# Altium integrated library Audio_Research.IntLib: 75 symbols
Pins are listed as number, name and electrical type; pins without a type are passive.

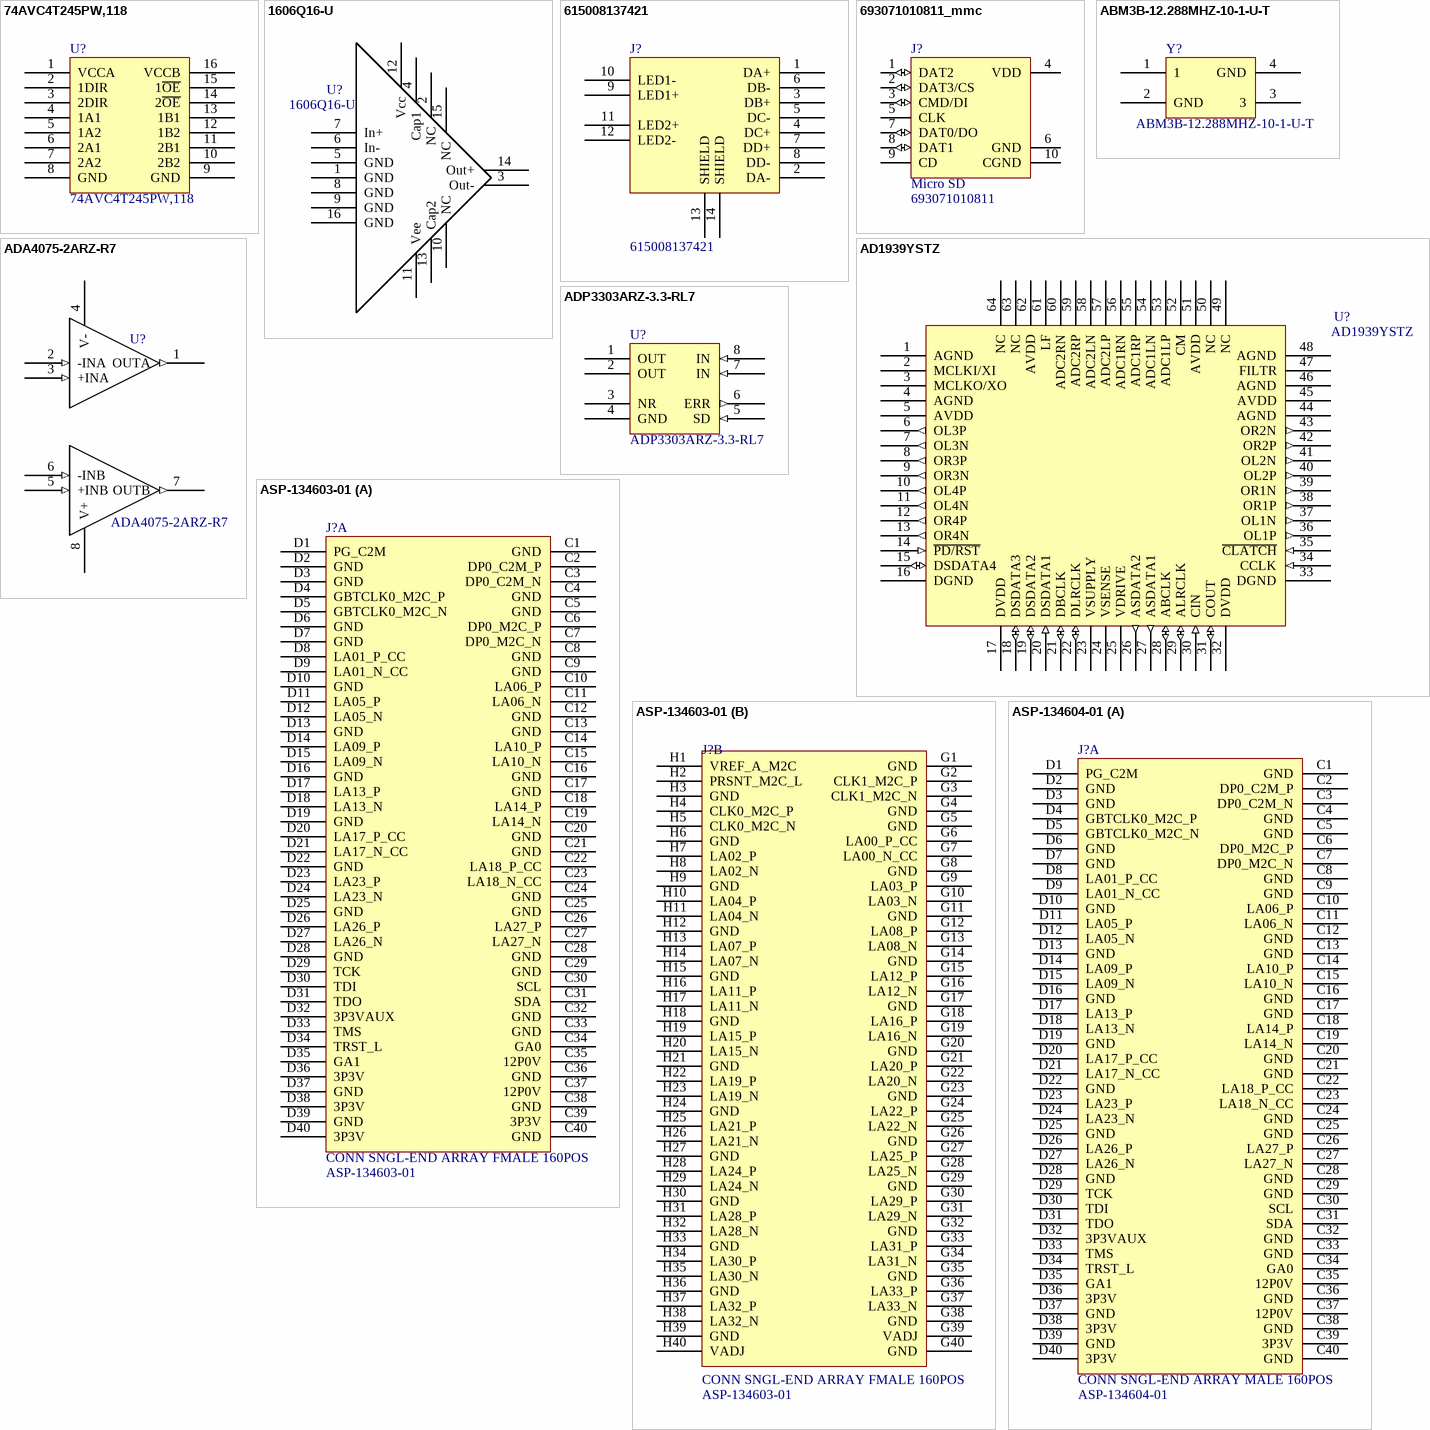
[diagram p0: symbols 74AVC4T245PW,118 to ASP-134604-01]

## 74AVC4T245PW,118
designator U?, comment Manufacturer Part Number: 74AVC4T245PW,118  (hidden comment: IC TXRX 4BIT DUAL 3ST 16TSSOP)
Voltage Level Translator Bidirectional 2 Circuit 2 Channel 380Mbps 16-TSSOP; Manufacturer: NXP Semiconductors; Max Supply Voltage: 3.6V; Min Supply Voltage: 800mV; Propagation Delay: 14.7ns; Number of Channels: 4; Number of Elements: 2; Logic Function: Transceiver,Translator; Low Level Output Current: 12mA; Turn-On Delay Time: 14.5ns; Polarity: Non-Inverting; High Level Output Current: -12mA; Quiescent Current: 70uA; Supplier 1: Digi-Key; Stock 1: 1680; Pricing 1: 1=0.9, 10=0.798, 25=0.72, 100=0.63, 250=0.5525, 500=0.49, 1000=0.3875 (USD); Mount: Surface Mount; Case/Package: TSSOP; Number of Pins: 16; Contact Plating: Gold; Min Operating Temperature: -40°C; Max Operating Temperature: 125°C; Packaging: Tape and Reel; Package Quantity: 2500; Data Rate: 380Mbps; Number of Bits: 4; Number of Circuits: 2; Radiation Hardening: No; Lead Free: Lead Free; ComponentLink1URL: https://datasheet.ciiva.com/1900/74avc4t245-1900214.pdf; ComponentLink1Description: https://datasheet.ciiva.com/1900/74avc4t245-1900214.pdf; ComponentLink2URL: https://datasheet.ciiva.com/1900/74avc4t245-1900215.pdf; ComponentLink2Description: https://datasheet.ciiva.com/1900/74avc4t245-1900215.pdf; ComponentLink3URL: https://datasheet.ciiva.com/1900/74avc4t245-1900216.pdf; ComponentLink3Description: https://datasheet.ciiva.com/1900/74avc4t245-1900216.pdf; ComponentLink4URL: https://datasheet.ciiva.com/15086/getdatasheetpartid-442686-15086830.pdf; ComponentLink4Description: https://datasheet.ciiva.com/15086/getdatasheetpartid-442686-15086830.pdf; Supplier Part Number 1: 568-8847-1-ND
footprint TSOP65P640X120-16N (TSOP, 16-Leads, Body 5.00x4.40mm, Pitch 0.65mm, IPC Medium Density)
pins: 1 VCCA, 2 1DIR, 3 2DIR, 4 1A1, 5 1A2, 6 2A1, 7 2A2, 8 GND, 9 GND, 10 2B2, 11 2B1, 12 1B2, 13 1B1, 14 2~{OE}, 15 1~{OE}, 16 VCCB

## 1606Q16-U
designator U?
Audio Amplifiers Balanced Audio Line Driver IC; Manufacturer: THAT; Max Supply Voltage: 18V; Min Supply Voltage: 4V; Nominal Supply Current: 4.9mA; Supplier 1: Mouser; Stock 1: 3475; Pricing 1: 1=4.65, 10=4.65, 50=3.91, 100=3.35, 1000=2.79, 10000=2.6 (USD); Case/Package: QSOP; Min Operating Temperature: -40°C; Max Operating Temperature: 85°C; Package Quantity: 98; Packaging: Rail/Tube; ComponentLink1URL: http://www.mouser.com/ds/2/407/1600data-6754.pdf; ComponentLink1Description: http://www.mouser.com/ds/2/407/1600data-6754.pdf; Supplier Part Number 1: 887-1606Q16-U; Manufacturer Part Number: 1606Q16-U
footprint SOP64P600X175-16N (SOP, 16-Leads, Body 4.89x3.90mm, Pitch 0.64mm, IPC Medium Density)
pins: 1 GND, 2 NC, 3 Out-, 4 Cap1, 5 GND, 6 In-, 7 In+, 8 GND, 9 GND, 10 NC, 11 Vee, 12 Vcc, 13 Cap2, 14 Out+, 15 NC, 16 GND

## 615008137421
designator J?, comment Manufacturer Part Number: 615008137421  (hidden comment: CONN MOD JACK 8P8C R/A SHIELDED)
Jack Modular Connector 8p8c (RJ45, Ethernet) 90° Angle (Right) Shielded, EMI Finger Cat5; Manufacturer: Wurth Electronics; Current Rating: 1.5A; Mating Cycles: 500; Gender: Female; Connector Type: RJ45,Socket,Jack; Voltage Rating (AC): 120V; Number of Positions: 8; Number of Ports: 1; Insulation Resistance: 500MR; Direction: Up; Supplier 1: Digi-Key; Stock 1: 1494; Pricing 1: 1=2.67, 10=2.621, 50=2.52, 100=2.419, 250=2.318 (USD); Mount: Through Hole,PCB; Contact Plating: Tin,Gold; Contact Material: Copper Alloy; Colour: Black,Green,Yellow; Housing Material: PBT; Min Operating Temperature: -40°C; Max Operating Temperature: 85°C; Shielding: Shielded; Packaging: Tray; Package Quantity: 60; Number of Rows: 1; Termination: Through Hole; Number of Contacts: 8; Orientation: Right Angle; Length: 13.46mm; Height: 16.93mm; Width: 16.25mm; Depth: 15.75mm; REACH SVHC: Unknown; Flammability Rating: UL94 V-0; ComponentLink1URL: https://datasheet.ciiva.com/11726/0900766b80f88673-11726176.pdf; ComponentLink1Description: https://datasheet.ciiva.com/11726/0900766b80f88673-11726176.pdf; ComponentLink2URL: https://datasheet.ciiva.com/4561/615008137421-71402-4561624.pdf; ComponentLink2Description: https://datasheet.ciiva.com/4561/615008137421-71402-4561624.pdf; ComponentLink3URL: https://datasheet.ciiva.com/686/615008137421-686729.pdf; ComponentLink3Description: https://datasheet.ciiva.com/686/615008137421-686729.pdf; ComponentLink4URL: https://datasheet.ciiva.com/6913/76606-6913951.pdf; ComponentLink4Description: https://datasheet.ciiva.com/6913/76606-6913951.pdf; ComponentLink5URL: https://datasheet.ciiva.com/48689/001088215-da-01-en-wr-com-modular-jack-615008137421-48689541.pdf; ComponentLink5Description: https://datasheet.ciiva.com/48689/001088215-da-01-en-wr-com-modular-jack-615008137421-48689541.pdf; Supplier Part Number 1: 732-2112-ND
footprint RJ45 (RJ45 Ethernet Connector)
pins: 1 DA+, 2 DA-, 3 DB+, 4 DC+, 5 DC-, 6 DB-, 7 DD+, 8 DD-, 9 LED1+, 10 LED1-, 11 LED2+, 12 LED2-, 13 SHIELD, 14 SHIELD

## 693071010811_mmc
designator J?, comment Micro SD  Manufacturer Part Number: 693071010811
CONN MICRO SD 8 POS SMD; Manufacturer: Wurth Electronics Inc; Number of Positions: 9 (8 + 1); Connector Type: Connector and Ejector; Insertion, Removal Method: Push In, Push Out; Card Type: Secure Digital - microSD; Supplier 1: Digi-Key; RoHS: RoHS Compliant; Category: Connectors, Interconnects; Stock 1: 6758; Pricing 1: 1=3.32, 10=3.188, 50=2.805, 100=2.6775, 500=2.295, 1400=2.10375 (USD); Packaging: Cut Tape (CT); Ejector Side: -; Mounting Type: Surface Mount, Right Angle; Features: Switch; Height Above Board: 0.072" (1.83mm); Mounting Feature: Normal, Standard - Top; Contact Finish: Gold; Contact Finish Thickness: -; ComponentLink1URL: http://katalog.we-online.de/em/datasheet/693071010811.pdf; ComponentLink1Description: http://katalog.we-online.de/em/datasheet/693071010811.pdf; Supplier Part Number 1: 732-3819-1-ND
footprint 693071010811 (CONN MICRO SD 8 POS SMD)
pins: 1 DAT2 (io), 2 DAT3/CS (io), 3 CMD/DI (io), 4 VDD (power), 5 CLK, 6 GND, 7 DAT0/DO (io), 8 DAT1 (io), 9 CD, 10 CGND

## ABM3B-12.288MHZ-10-1-U-T
designator Y?
12.288MHz ±10ppm Crystal 10pF 70 Ohm -10°C ~ 60°C Surface Mount 4-SMD, No Lead (DFN, LCC); Manufacturer: Abracon LLC; ESR (Equivalent Series Resistance): 70 Ohm; Operating Mode: Fundamental; Supplier 1: Digi-Key; RoHS: RoHS Compliant; Category: Crystals and Oscillators; Stock 1: 1220; Pricing 1: 1=1.09, 10=0.968, 50=0.904, 100=0.8, 500=0.756 (USD); Packaging: Cut Tape (CT); Part Status: Active; Type: MHz Crystal; Frequency: 12.288MHz; Frequency Stability: ±10ppm; Frequency Tolerance: ±10ppm; Load Capacitance: 10pF; Operating Temperature: -10°C ~ 60°C; Ratings: -; Mounting Type: Surface Mount; Package / Case: 4-SMD, No Lead (DFN, LCC); Size / Dimension: 0.197" L x 0.126" W (5.00mm x 3.20mm); Height: 0.043" (1.10mm); ComponentLink1URL: http://www.abracon.com/Resonators/abm3b.pdf; ComponentLink1Description: http://www.abracon.com/Resonators/abm3b.pdf; Supplier Part Number 1: 300-8198-1-ND; Manufacturer Part Number: ABM3B-12.288MHZ-10-1-U-T
footprint ADM3B (Ceramic SMD Crystal)
pins: 1, 2 GND, 3, 4 GND

## AD1939YSTZ
designator U?
Single-chip codec that prvides 4 ADCs with differential input and 8 DACs with differential output; Manufacturer: Analog Devices Inc.; Data Interface: Serial; Resolution (Bits): 24 b; Number of ADCs / DACs: 4 / 8; Sigma Delta: Yes; S/N Ratio, ADCs / DACs (db) Typ: 94 / 94; Dynamic Range, ADCs / DACs (db) Typ: 105 / 110; Voltage - Supply, Analog: 3 V ~ 3.6 V; Supplier 1: Digi-Key; RoHS: RoHS Compliant; Category: Integrated Circuits (ICs); Stock 1: 432; Pricing 1: 1=15.81, 10=14.527, 100=12.269, 500=10.91416, 1000=10.01091, 2500=9.63456, 5000=9.33348 (USD); Packaging: Tray; Type: General Purpose; Voltage - Supply, Digital: 3 V ~ 3.6 V; Operating Temperature: -40°C ~ 105°C; Mounting Type: Surface Mount; Package / Case: 64-LQFP; Supplier Device Package: 64-LQFP (10x10); ComponentLink1URL: http://www.analog.com/media/en/technical-documentation/data-sheets/AD1939.pdf; ComponentLink1Description: http://www.analog.com/media/en/technical-documentation/data-sheets/AD1939.pdf; Supplier Part Number 1: AD1939YSTZ-ND; Manufacturer Part Number: AD1939YSTZ
footprint ST_64_2
pins: 1 AGND "Analog Ground", 2 MCLKI/XI "Master Clock Input/Crystal Oscillator Input", 3 MCLKO/XO "Master Clock Output/Crystal Oscillator Output", 4 AGND "Analog Ground", 5 AVDD "Analog Power Supply. Connect to analog 3.3V Supply", 6 OL3P (out) "DAC 3 Left Positive Output", 7 OL3N (out) "DAC 3 Left Negative Output", 8 OR3P (out) "DAC 3 Right Positive Output", 9 OR3N (out) "DAC 3 Right Neagtive Output", 10 OL4P (out) "DAC 4 Left Positivie Output", 11 OL4N (out) "DAC 4 Left Negative Output", 12 OR4P (out) "DAC 4 Right Positivie Output", 13 OR4N (out) "DAC 4 Right Negative Output", 14 ~{PD/RST} (in) "Power-Down Reset (Active Low)", 15 DSDATA4 (io) "DAC Sderial Data Input 4. Data input to DAC4 data in/TDM DAC2 data out (dual-line mode)/AUX DAC2 data out (to external DAC2)", 16 DGND "Digital Ground", 17 DVDD "Digital Power Supply. Connect to digital 3.3 V supply", 18 DSDATA3 (io) "DAC Serial Data Input 3. Data input to DAC3 data in/TDM DAC2 data out (dual-line mode)/AUX DAC2 data out (to external DAC2)", 19 DSDATA2 (io) "DAC Serial Data Input 2. Data input to DAC2 data in/TDM DAC data out/AUX ADC1 data in (from external ADC1)", 20 DSDATA1 (in) "DAC Serial Data Input 1. Data input to Dac1 data in/TDM DAC data in/TDM data in", 21 DBCLK (io) "Bit Clock fo DACs", 22 DLRCLK (io) "LR Clock for DACs", 23 VSUPPLY "5V Input to Regulator, Emitter of Pass Transistor", 24 VSENSE "3.3V Output of Regulator Collector of Pass Transistor", 25 VDRIVE "Drive for Base of Pass Transistro", 26 ASDATA2 (out) "ADC Serial Data Output 2. Data Output from ADC2/TDM ADC data in/AUX DAC1 data out (to external DAC1).", 27 ASDATA1 (out) "ADC Serial Data Output 1. Data Output from ADC1/TDM ADC data out/TDM data out", 28 ABCLK (io) "Bit Clock fo ADCs", 29 ALRCLK (io) "LR Clock for ADCs", 30 CIN (in) "Control Data Input (SPI)", 31 COUT (io) "Control Data Output (SPI)", 32 DVDD "Digitial Power Supply. Connect to digital 3.3V supply", 33 DGND "Digital Ground", 34 CCLK (in) "Control Clock Input (SPI)", 35 ~{CLATCH} (in) "Latch Input for Control Data (SPI)", 36 OL1P (out) "DAC 1 Left Positive Output", 37 OL1N (out) "DAC 1 Left Negative Output", 38 OR1P (out) "DAC 1 Right Positive Output", 39 OR1N (out) "DAC 1 Right Negative Output", 40 OL2P (out) "DAC 2 Left Positive Output", 41 OL2N (out) "DAC Left Negative Output", 42 OR2P (out) "DAC 2 Right Positive Output", 43 OR2N (out) "DAC 2 Right Negative Output", 44 AGND "Analog Ground", 45 AVDD "Analog Power Supply. Connect to analog 3.3V", 46 AGND "Analog Ground", 47 FILTR "Voltage Reference Filter Capacitor Connection. Bypass with 10uF||100nF to AGND", 48 AGND "Analog Ground", 49 NC "No Connect", 50 NC "No Connect", 51 AVDD "Analog Power Supply. Connect to analog 3.3V Supply", 52 CM "Common-Mode Reference Filter Capacitor Connection.  Bypass with 47uF||100nF to AGND", 53 ADC1LP "ADC 1 Left Positive Input", 54 ADC1LN "ADC 1 Left Negative Input", 55 ADC1RP "ADC1 Right Positive Input", 56 ADC1RN "ACDC 1 Right Negative INput", 57 ADC2LP "ADC 2 Left Positive Input", 58 ADC2LN "ADC 2 Left Negative Input", 59 ADC2RP "ADC 2 Right Positive INput", 60 ADC2RN "ADC 2 Right Negative Input", 61 LF "PLL Loop Filter, Return to AVDD", 62 AVDD "Analog Power Supply. Connect to analog 3.3V Supply", 63 NC "No Connect", 64 NC "No Connect"

## ADA4075-2ARZ-R7
designator U?
IC OPAMP GP 6.5MHZ 8SOIC; Manufacturer: Analog Devices Inc.; Amplifier Type: General Purpose; Number of Circuits: 2; Slew Rate: 12 V/µs; Current - Input Bias: 30nA; Voltage - Input Offset: 200µV; Current - Supply: 1.8mA; Current - Output / Channel: 40mA; Voltage - Supply, Single/Dual (±): ±4.5 V ~ 18 V; Supplier 1: Digi-Key; RoHS: RoHS Compliant; Category: Integrated Circuits (ICs); Stock 1: 11196; Pricing 1: 1=2.28, 10=2.05, 100=1.6441, 500=1.35136 (USD); Packaging: Cut Tape (CT); Part Status: Active; Output Type: -; Gain Bandwidth Product: 6.5MHz; -3db Bandwidth: -; Operating Temperature: -40°C ~ 125°C; Mounting Type: Surface Mount; Package / Case: 8-SOIC (0.154", 3.90mm Width); Supplier Device Package: 8-SOIC; ComponentLink1URL: http://www.analog.com/media/en/technical-documentation/data-sheets/ADA4075-2.pdf; ComponentLink1Description: http://www.analog.com/media/en/technical-documentation/data-sheets/ADA4075-2.pdf; Supplier Part Number 1: ADA4075-2ARZ-R7CT-ND; Manufacturer Part Number: ADA4075-2ARZ-R7
footprint SOIC127P600X175-8L (SOIC, 8-Leads, Body 5.0x4.0mm (max), Pitch 1.27mm, IPC High Density)
pins: 1 OUTA (out), 2 -INA (in), 3 +INA (in), 4 V-, 5 +INB (in), 6 -INB (in), 7 OUTB (out), 8 V+

## ADP3303ARZ-3.3-RL7
designator U?
Linear Voltage Regulator IC Positive Fixed 1 Output 3.3V 200mA 8-SOIC; Manufacturer: Analog Devices Inc.; Voltage - Dropout (Typical): 0.18V @ 200mA; Number of Regulators: 1; Voltage - Input: Up to 12V; Supplier 1: Digi-Key; RoHS: RoHS Compliant; Category: Integrated Circuits (ICs); Stock 1: 2012; Pricing 1: 1=3.19, 10=2.867, 100=2.3517, 500=2.0007 (USD); Packaging: Cut Tape (CT); Part Status: Active; Regulator Topology: Positive Fixed; Voltage - Output: 3.3V; Current - Output: 200mA; Current - Limit (Min): -; Operating Temperature: -25°C ~ 125°C; Mounting Type: Surface Mount; Package / Case: 8-SOIC (0.154", 3.90mm Width); Supplier Device Package: 8-SOIC; ComponentLink1URL: http://www.analog.com/media/en/technical-documentation/data-sheets/ADP3303.pdf; ComponentLink1Description: http://www.analog.com/media/en/technical-documentation/data-sheets/ADP3303.pdf; Supplier Part Number 1: ADP3303ARZ-3.3-RL7CT-ND; Manufacturer Part Number: ADP3303ARZ-3.3-RL7
footprint SOIC127P600X175-8L (SOIC, 8-Leads, Body 5.0x4.0mm (max), Pitch 1.27mm, IPC High Density)
pins: 1 OUT "Output of the Regulator. Bypass to ground with a 0.47 µF or larger capacitor. Pin 1 and Pin 2 must be connected  together for proper operation.", 2 OUT "Output of the Regulator. Bypass to ground with a 0.47 µF or larger capacitor. Pin 1 and Pin 2 must be connected  together for proper operation.", 3 NR "Noise Reduction Pin. Used for reduction of the output noise. See the Noise Reduction section for details. No  connection if not used.", 4 GND "Ground Pin.", 5 SD (in) "Active Low Shutdown Pin. Connect to ground to disable the regulator output. When shutdown is not used,  connect this pin to the input pin.", 6 ERR (out) "Open Collector Output. Goes low to indicate that the output is about to go out of regulation.", 7 IN (in) "Regulator Input. Pin 7 and Pin 8 must be connected together for proper operation.", 8 IN (in) "Regulator Input. Pin 7 and Pin 8 must be connected together for proper operation."

## ASP-134603-01
designator J?, comment CONN SNGL-END ARRAY FMALE 160POS  Manufacturer Part Number: ASP-134603-01
Low Pin Count Female FPGA Mezzanine Card Connector; Manufacturer: Samtec; Number of Positions: 160; Gender: Receptacle; Pitch: 1.27mm; Supplier 1: Digi-Key; Stock 1: 418; Pricing 1: 1=12.68, 10=12.253, 25=11.83, 50=11.4076, 100=10.985, 250=10.7738, 500=10.5625 (USD); Mount: Surface Mount; Contact Plating: Nickel,Gold; Contact Material: Copper Alloy; Housing Colour: Black; Number of Rows: 4; Packaging: Tape and Reel; Termination: Solder; Number of Contacts: 160; Orientation: Straight; Depth: 13.23mm; Radiation Hardening: No; REACH SVHC: No SVHC; ComponentLink1URL: https://datasheet.ciiva.com/403/asp-134603-01-403748.pdf; ComponentLink1Description: https://datasheet.ciiva.com/403/asp-134603-01-403748.pdf; ComponentLink2URL: https://datasheet.ciiva.com/26877/getdatasheetpartid-748375-26877304.pdf; ComponentLink2Description: https://datasheet.ciiva.com/26877/getdatasheetpartid-748375-26877304.pdf; Supplier Part Number 1: SAM8729-ND
footprint ASP-134603-01 (Low Pin Count Female FPGA Mezzanine Card Connector)
part A pins: C1 GND (power), C2 DP0_C2M_P, C3 DP0_C2M_N, C4 GND (power), C5 GND (power), C6 DP0_M2C_P, C7 DP0_M2C_N, C8 GND (power), C9 GND (power), C10 LA06_P, C11 LA06_N, C12 GND (power), C13 GND (power), C14 LA10_P, C15 LA10_N, C16 GND (power), C17 GND (power), C18 LA14_P, C19 LA14_N, C20 GND (power), C21 GND (power), C22 LA18_P_CC, C23 LA18_N_CC, C24 GND (power), C25 GND (power), C26 LA27_P, C27 LA27_N, C28 GND (power), C29 GND (power), C30 SCL, C31 SDA, C32 GND (power), C33 GND (power), C34 GA0, C35 12P0V (power), C36 GND (power), C37 12P0V (power), C38 GND (power), C39 3P3V (power), C40 GND (power), D1 PG_C2M, D2 GND (power), D3 GND (power), D4 GBTCLK0_M2C_P, D5 GBTCLK0_M2C_N, D6 GND (power), D7 GND (power), D8 LA01_P_CC, D9 LA01_N_CC, D10 GND (power), D11 LA05_P, D12 LA05_N, D13 GND (power), D14 LA09_P, D15 LA09_N, D16 GND (power), D17 LA13_P, D18 LA13_N, D19 GND (power), D20 LA17_P_CC, D21 LA17_N_CC, D22 GND (power), D23 LA23_P, D24 LA23_N, D25 GND (power), D26 LA26_P, D27 LA26_N, D28 GND (power), D29 TCK, D30 TDI, D31 TDO, D32 3P3VAUX (power), D33 TMS, D34 TRST_L, D35 GA1, D36 3P3V (power), D37 GND (power), D38 3P3V (power), D39 GND (power), D40 3P3V (power)
part B pins: G1 GND (power), G2 CLK1_M2C_P, G3 CLK1_M2C_N, G4 GND (power), G5 GND (power), G6 LA00_P_CC, G7 LA00_N_CC, G8 GND (power), G9 LA03_P, G10 LA03_N, G11 GND (power), G12 LA08_P, G13 LA08_N, G14 GND (power), G15 LA12_P, G16 LA12_N, G17 GND (power), G18 LA16_P, G19 LA16_N, G20 GND (power), G21 LA20_P, G22 LA20_N, G23 GND (power), G24 LA22_P, G25 LA22_N, G26 GND (power), G27 LA25_P, G28 LA25_N, G29 GND (power), G30 LA29_P, G31 LA29_N, G32 GND (power), G33 LA31_P, G34 LA31_N, G35 GND (power), G36 LA33_P, G37 LA33_N, G38 GND (power), G39 VADJ (power), G40 GND (power), H1 VREF_A_M2C (power), H2 PRSNT_M2C_L, H3 GND (power), H4 CLK0_M2C_P, H5 CLK0_M2C_N, H6 GND (power), H7 LA02_P, H8 LA02_N, H9 GND (power), H10 LA04_P, H11 LA04_N, H12 GND (power), H13 LA07_P, H14 LA07_N, H15 GND (power), H16 LA11_P, H17 LA11_N, H18 GND (power), H19 LA15_P, H20 LA15_N, H21 GND (power), H22 LA19_P, H23 LA19_N, H24 GND (power), H25 LA21_P, H26 LA21_N, H27 GND (power), H28 LA24_P, H29 LA24_N, H30 GND (power), H31 LA28_P, H32 LA28_N, H33 GND (power), H34 LA30_P, H35 LA30_N, H36 GND (power), H37 LA32_P, H38 LA32_N, H39 GND (power), H40 VADJ (power)

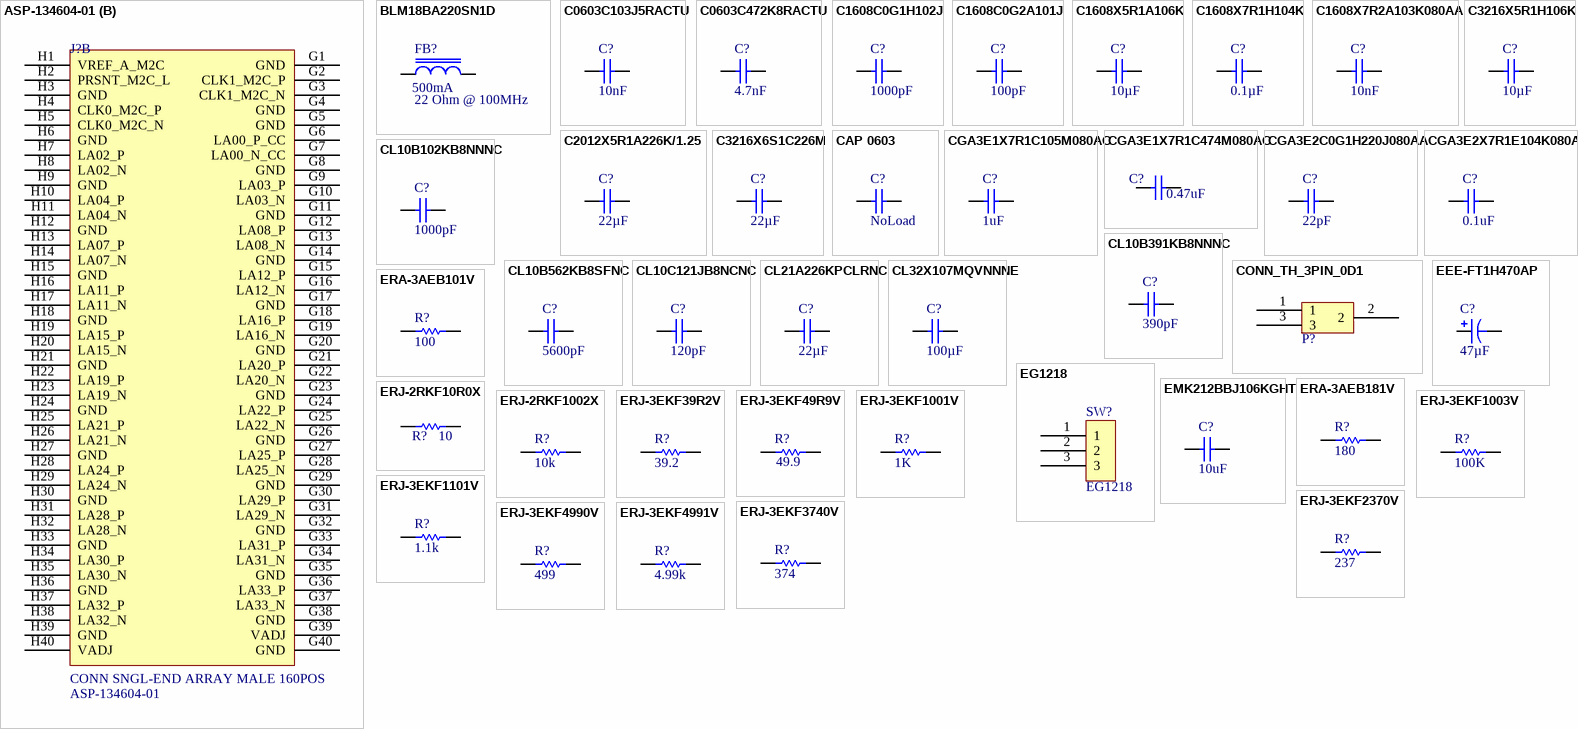
[diagram p1: symbols ASP-134604-01 to ERJ-3EKF4991V]

## ASP-134604-01
designator J?, comment CONN SNGL-END ARRAY MALE 160POS  Manufacturer Part Number: ASP-134604-01
Low Pin Count 10mm Male FPGA Mezzanine Card Connector; Manufacturer: Samtec; Number of Contacts: 400; Number of Positions: 160; Pitch: 0.05inch; Supplier 1: Digi-Key; Stock 1: 825; Pricing 1: 1=13.68, 10=13.224, 25=12.768, 50=12.312, 100=11.856, 250=11.628, 500=11.4 (USD); Mount: Surface Mount; Contact Plating: Nickel,Gold; Contact Material: Copper Alloy; Number of Rows: 4; Termination: SMD/SMT; Packaging: Tape and Reel; Gender: Male; Radiation Hardening: No; REACH SVHC: No SVHC; ComponentLink1URL: https://datasheet.ciiva.com/403/asp-134604-01-403751.pdf; ComponentLink1Description: https://datasheet.ciiva.com/403/asp-134604-01-403751.pdf; ComponentLink2URL: https://datasheet.ciiva.com/9532/asp-134604-01-9532665.pdf; ComponentLink2Description: https://datasheet.ciiva.com/9532/asp-134604-01-9532665.pdf; Supplier Part Number 1: SAM8732-ND
footprint ASP-134604-01 (Low Pin Count 10mm Male FPGA Mezzanine Card Connector)
part A pins: C1 GND (power), C2 DP0_C2M_P, C3 DP0_C2M_N, C4 GND (power), C5 GND (power), C6 DP0_M2C_P, C7 DP0_M2C_N, C8 GND (power), C9 GND (power), C10 LA06_P, C11 LA06_N, C12 GND (power), C13 GND (power), C14 LA10_P, C15 LA10_N, C16 GND (power), C17 GND (power), C18 LA14_P, C19 LA14_N, C20 GND (power), C21 GND (power), C22 LA18_P_CC, C23 LA18_N_CC, C24 GND (power), C25 GND (power), C26 LA27_P, C27 LA27_N, C28 GND (power), C29 GND (power), C30 SCL, C31 SDA, C32 GND (power), C33 GND (power), C34 GA0, C35 12P0V (power), C36 GND (power), C37 12P0V (power), C38 GND (power), C39 3P3V (power), C40 GND (power), D1 PG_C2M, D2 GND (power), D3 GND (power), D4 GBTCLK0_M2C_P, D5 GBTCLK0_M2C_N, D6 GND (power), D7 GND (power), D8 LA01_P_CC, D9 LA01_N_CC, D10 GND (power), D11 LA05_P, D12 LA05_N, D13 GND (power), D14 LA09_P, D15 LA09_N, D16 GND (power), D17 LA13_P, D18 LA13_N, D19 GND (power), D20 LA17_P_CC, D21 LA17_N_CC, D22 GND (power), D23 LA23_P, D24 LA23_N, D25 GND (power), D26 LA26_P, D27 LA26_N, D28 GND (power), D29 TCK, D30 TDI, D31 TDO, D32 3P3VAUX (power), D33 TMS, D34 TRST_L, D35 GA1, D36 3P3V (power), D37 GND (power), D38 3P3V (power), D39 GND (power), D40 3P3V (power)
part B pins: G1 GND (power), G2 CLK1_M2C_P, G3 CLK1_M2C_N, G4 GND (power), G5 GND (power), G6 LA00_P_CC, G7 LA00_N_CC, G8 GND (power), G9 LA03_P, G10 LA03_N, G11 GND (power), G12 LA08_P, G13 LA08_N, G14 GND (power), G15 LA12_P, G16 LA12_N, G17 GND (power), G18 LA16_P, G19 LA16_N, G20 GND (power), G21 LA20_P, G22 LA20_N, G23 GND (power), G24 LA22_P, G25 LA22_N, G26 GND (power), G27 LA25_P, G28 LA25_N, G29 GND (power), G30 LA29_P, G31 LA29_N, G32 GND (power), G33 LA31_P, G34 LA31_N, G35 GND (power), G36 LA33_P, G37 LA33_N, G38 GND (power), G39 VADJ (power), G40 GND (power), H1 VREF_A_M2C (power), H2 PRSNT_M2C_L, H3 GND (power), H4 CLK0_M2C_P, H5 CLK0_M2C_N, H6 GND (power), H7 LA02_P, H8 LA02_N, H9 GND (power), H10 LA04_P, H11 LA04_N, H12 GND (power), H13 LA07_P, H14 LA07_N, H15 GND (power), H16 LA11_P, H17 LA11_N, H18 GND (power), H19 LA15_P, H20 LA15_N, H21 GND (power), H22 LA19_P, H23 LA19_N, H24 GND (power), H25 LA21_P, H26 LA21_N, H27 GND (power), H28 LA24_P, H29 LA24_N, H30 GND (power), H31 LA28_P, H32 LA28_N, H33 GND (power), H34 LA30_P, H35 LA30_N, H36 GND (power), H37 LA32_P, H38 LA32_N, H39 GND (power), H40 VADJ (power)

## BLM18BA220SN1D
designator FB?  Current Rating: 500mA  Impedance @ Frequency: 22 Ohm @ 100MHz  (hidden comment: BLM18BA220SN1D)
FERRITE CHIP 22 OHM 500MA 0603; Manufacturer: Murata Electronics North America; DC Resistance (DCR): 350 mOhm Max; Filter Type: Differential Mode - Single; Supplier 1: Digi-Key; Manufacturer Part Number: BLM18BA220SN1D; RoHS: RoHS Compliant; Category: Filters; Stock 1: 10969; Pricing 1: 1=0.24, 10=0.18, 50=0.105, 100=0.084, 250=0.06, 500=0.0408, 1000=0.033 (USD); Package / Case: 0603 (1608 Metric); Mounting Type: Surface Mount; Packaging: Cut Tape (CT); Height (Max): 0.037" (0.95mm); Size / Dimension: 0.063" L x 0.031" W (1.60mm x 0.80mm); ComponentLink1URL: http://search.murata.co.jp/Ceramy/image/img/PDF/ENG/L0110S0100BLM18B.pdf; ComponentLink1Description: http://search.murata.co.jp/Ceramy/image/img/PDF/ENG/L0110S0100BLM18B.pdf; Supplier Part Number 1: 490-1016-1-ND; Load Status: *
footprint 3-0603_L (Chip Capacitor, Body 1.6x0.8mm, IPC High Density)
pins: 1, 2

## C0603C103J5RACTU
designator C?  Capacitance: 10nF  (hidden comment: C0603C103J5RACTU)
CAP CER 10000PF 50V 5% X7R 0603; Manufacturer: Kemet; Supplier 1: Digi-Key; Manufacturer Part Number: C0603C103J5RACTU; RoHS: RoHS Compliant; Category: Capacitors; Stock 1: 187680; Pricing 1: 1=0.1, 10=0.036, 50=0.0196, 100=0.0165, 250=0.01352, 500=0.01156, 1000=0.009 (USD); Voltage - Rated: 50V; Tolerance: ±5%; Temperature Coefficient: X7R; Mounting Type: Surface Mount, MLCC; Operating Temperature: -55°C ~ 125°C; Applications: General Purpose; Ratings: -; Package / Case: 0603 (1608 Metric); Size / Dimension: 0.063" L x 0.031" W (1.60mm x 0.80mm); Height - Seated (Max): -; Thickness (Max): 0.034" (0.87mm); Lead Spacing: -; Features: -; Packaging: Cut Tape (CT); Lead Style: -; ComponentLink1URL: http://www.kemet.com/datasheets&C0603C103J5RACTU; ComponentLink1Description: http://www.kemet.com/datasheets&C0603C103J5RACTU; Supplier Part Number 1: 399-1092-1-ND
footprint 3-0603_L (Chip Capacitor, Body 1.6x0.8mm, IPC High Density)
pins: 1, 2

## C0603C472K8RACTU
designator C?  Capacitance: 4.7nF  (hidden comment: C0603C472K8RACTU)
CAP CER 4700PF 10V X7R 0603; Manufacturer: KEMET; Dielectric Material: Ceramic; Tolerance: 10%; Supplier 1: Digi-Key; Manufacturer Part Number: C0603C472K8RACTU; Stock 1: 15005; Pricing 1: 1=0.1, 10=0.053, 100=0.0236, 500=0.0168, 1000=0.0132 (USD); Mount: Surface Mount; Case/Package: 0603; Case Code (Metric): 1608; Case Code (Imperial): 0603; Contact Plating: Tin,Matte; Min Operating Temperature: -55°C; Max Operating Temperature: 125°C; Voltage Rating: 10V; Packaging: Tape and Reel; Package Quantity: 4000; Voltage Rating (DC): 10V; Dielectric: X7R; Termination: SMD/SMT; Length: 1.6mm; Width: 0.031inch; Thickness: 0.034inch; Depth: 0.8mm; REACH SVHC: No SVHC; ComponentLink1URL: http://www.mouser.com/ds/2/212/KEM_C1002_X7R_SMD-1102033.pdf; ComponentLink1Description: http://www.mouser.com/ds/2/212/KEM_C1002_X7R_SMD-1102033.pdf; ComponentLink2URL: http://components.arrow.com/part/dataview/3445604S8609586N7429; ComponentLink2Description: http://components.arrow.com/part/dataview/3445604S8609586N7429; ComponentLink3URL: https://search.kemet.com/component-edge/download/datasheet/C0603C472K8RACTU.pdf; ComponentLink3Description: https://search.kemet.com/component-edge/download/datasheet/C0603C472K8RACTU.pdf; ComponentLink4URL: http://capacitoredge.kemet.com/capedge2/DataSheet?pn=C0603C472K8RAC7867; ComponentLink4Description: http://capacitoredge.kemet.com/capedge2/DataSheet?pn=C0603C472K8RAC7867; Supplier Part Number 1: 399-9092-6-ND
footprint 3-0603_L (Chip Capacitor, Body 1.6x0.8mm, IPC High Density)
pins: 1, 2

## C1608C0G1H102J
designator C?  Capacitance: 1000pF  (hidden comment: C1608C0G1H102J)
CAP CER 1000PF 50V 5% NP0 0603; Manufacturer: TDK Corporation; Temperature Coefficient: C0G, NP0; Supplier 1: Digi-Key; Manufacturer Part Number: C1608C0G1H102J; RoHS: RoHS Compliant; Category: Capacitors; Stock 1: 229834; Pricing 1: 10=0.078, 100=0.0358, 250=0.02924, 500=0.02502, 1000=0.0195 (USD); Voltage - Rated: 50V; Tolerance: ±5%; Mounting Type: Surface Mount, MLCC; Operating Temperature: -55°C ~ 125°C; Applications: General Purpose; Ratings: -; Package / Case: 0603 (1608 Metric); Size / Dimension: 0.063" L x 0.031" W (1.60mm x 0.80mm); Height - Seated (Max): -; Thickness (Max): 0.037" (0.95mm); Lead Spacing: -; Features: -; Packaging: Cut Tape (CT); Lead Style: -; ComponentLink1URL: http://www.tdk.com/pdf/general_B11.pdf; ComponentLink1Description: http://www.tdk.com/pdf/general_B11.pdf; Supplier Part Number 1: 445-1293-1-ND
footprint 3-0603_L (Chip Capacitor, Body 1.6x0.8mm, IPC High Density)
pins: 1, 2

## C1608C0G2A101J
designator C?  Capacitance: 100pF  (hidden comment: C1608C0G2A101J)
CAP CER 100PF 100V 5% NP0 0603; Manufacturer: TDK Corporation; Temperature Coefficient: C0G, NP0; Supplier 1: Digi-Key; Manufacturer Part Number: C1608C0G2A101J; RoHS: RoHS Compliant; Category: Capacitors; Stock 1: 128588; Pricing 1: 10=0.05, 100=0.0231, 250=0.01892, 500=0.01618, 1000=0.0126 (USD); Voltage - Rated: 100V; Tolerance: ±5%; Mounting Type: Surface Mount, MLCC; Operating Temperature: -55°C ~ 125°C; Applications: General Purpose; Ratings: -; Package / Case: 0603 (1608 Metric); Size / Dimension: 0.063" L x 0.031" W (1.60mm x 0.80mm); Height - Seated (Max): -; Thickness (Max): 0.037" (0.95mm); Lead Spacing: -; Features: -; Packaging: Cut Tape (CT); Lead Style: -; ComponentLink1URL: http://www.tdk.com/pdf/mid_volt_B11.pdf; ComponentLink1Description: http://www.tdk.com/pdf/mid_volt_B11.pdf; Supplier Part Number 1: 445-2306-1-ND; Load Status: *
footprint 3-0603_L (Chip Capacitor, Body 1.6x0.8mm, IPC High Density)
pins: 1, 2

## C1608X5R1A106K
designator C?  Capacitance: 10µF  (hidden comment: C1608X5R1A106K)
CAP CER 10UF 10V 10% X5R 0603; Manufacturer: TDK Corporation; Supplier 1: Digi-Key; Manufacturer Part Number: C1608X5R1A106K; RoHS: RoHS Compliant; Category: Capacitors; Stock 1: 36523; Pricing 1: 1=0.48, 10=0.42, 100=0.21, 250=0.168, 500=0.153, 1000=0.138 (USD); Voltage - Rated: 10V; Tolerance: ±10%; Temperature Coefficient: X5R; Mounting Type: Surface Mount, MLCC; Operating Temperature: -55°C ~ 85°C; Applications: General Purpose; Ratings: -; Package / Case: 0603 (1608 Metric); Size / Dimension: 0.063" L x 0.031" W (1.60mm x 0.80mm); Height - Seated (Max): -; Thickness (Max): 0.035" (0.90mm); Lead Spacing: -; Features: -; Packaging: Cut Tape (CT); Lead Style: -; ComponentLink1URL: http://www.tdk.com/pdf/general_B11.pdf; ComponentLink1Description: http://www.tdk.com/pdf/general_B11.pdf; Supplier Part Number 1: 445-7486-1-ND
footprint 3-0603_L (Chip Capacitor, Body 1.6x0.8mm, IPC High Density)
pins: 1, 2

## C1608X7R1H104K
designator C?  Capacitance: 0.1µF  (hidden comment: C1608X7R1H104K)
CAP CER 0.1UF 50V 10% X7R 0603; Manufacturer: TDK Corporation; Supplier 1: Digi-Key; Manufacturer Part Number: C1608X7R1H104K; RoHS: RoHS Compliant; Category: Capacitors; Stock 1: 2442296; Pricing 1: 10=0.048, 100=0.022, 250=0.018, 500=0.0154, 1000=0.012 (USD); Voltage - Rated: 50V; Tolerance: ±10%; Temperature Coefficient: X7R; Mounting Type: Surface Mount, MLCC; Operating Temperature: -55°C ~ 125°C; Applications: General Purpose; Ratings: -; Package / Case: 0603 (1608 Metric); Size / Dimension: 0.063" L x 0.031" W (1.60mm x 0.80mm); Height - Seated (Max): -; Thickness (Max): 0.037" (0.95mm); Lead Spacing: -; Features: -; Packaging: Cut Tape (CT); Lead Style: -; ComponentLink1URL: http://www.tdk.com/pdf/general_B11.pdf; ComponentLink1Description: http://www.tdk.com/pdf/general_B11.pdf; Supplier Part Number 1: 445-1314-1-ND
footprint 3-0603_L (Chip Capacitor, Body 1.6x0.8mm, IPC High Density)
pins: 1, 2

## C1608X7R2A103K080AA
designator C?  Capacitance: 10nF  (hidden comment: C1608X7R2A103K080AA)
CAP CER 10000PF 100V X7R 0603; Manufacturer: TDK Corporation; Tolerance: ±10%; Supplier 1: Digi-Key; Manufacturer Part Number: C1608X7R2A103K080AA; RoHS: RoHS Compliant; Category: Capacitors; Stock 1: 257721; Pricing 1: 1=0.1, 10=0.06, 100=0.0275, 250=0.02252, 500=0.01926, 1000=0.015 (USD); Packaging: Cut Tape (CT); Voltage - Rated: 100V; Temperature Coefficient: X7R; Mounting Type: Surface Mount, MLCC; Operating Temperature: -55°C ~ 125°C; Applications: General Purpose; Ratings: -; Package / Case: 0603 (1608 Metric); Size / Dimension: 0.063" L x 0.031" W (1.60mm x 0.80mm); Height - Seated (Max): -; Thickness (Max): 0.037" (0.95mm); Lead Spacing: -; Features: -; Lead Style: -; ComponentLink1URL: http://product.tdk.com/capacitor/mlcc/en/documents/mlcc_commercial_midvoltage_en.pdf; ComponentLink1Description: http://product.tdk.com/capacitor/mlcc/en/documents/mlcc_commercial_midvoltage_en.pdf; Supplier Part Number 1: 445-1304-1-ND
footprint 3-0603_L (Chip Capacitor, Body 1.6x0.8mm, IPC High Density)
pins: 1, 2

## C2012X5R1A226K/1.25
designator C?  Capacitance: 22µF  (hidden comment: C2012X5R1A226K/1.25)
CAP CER 22UF 10V 10% X5R 0805; Manufacturer: TDK Corporation; Supplier 1: Digi-Key; Manufacturer Part Number: C2012X5R1A226K/1.25; RoHS: RoHS Compliant; Category: Capacitors; Stock 1: 8068; Pricing 1: 1=0.7, 10=0.67, 100=0.325, 250=0.27, 500=0.245, 1000=0.225 (USD); Voltage - Rated: 10V; Tolerance: ±10%; Temperature Coefficient: X5R; Mounting Type: Surface Mount, MLCC; Operating Temperature: -55°C ~ 85°C; Applications: General Purpose; Ratings: -; Package / Case: 0805 (2012 Metric); Size / Dimension: 0.079" L x 0.049" W (2.00mm x 1.25mm); Height - Seated (Max): -; Thickness (Max): 0.057" (1.45mm); Lead Spacing: -; Features: -; Packaging: Cut Tape (CT); Lead Style: -; ComponentLink1URL: http://www.tdk.com/pdf/general_B11.pdf; ComponentLink1Description: http://www.tdk.com/pdf/general_B11.pdf; Supplier Part Number 1: 445-7664-1-ND
footprint 6-0805_L (Chip Capacitor, Body 2.0x1.2mm, IPC High Density)
pins: 1, 2

## C3216X5R1H106K
designator C?  Capacitance: 10µF  (hidden comment: C3216X5R1H106K)